# Altium integrated library Supernova Connectors.IntLib: 270 symbols (part 1 of 2) (continued)
## BNC
designator J?
Header BNC Board Edge; Supplier 1: Digi-Key; Supplier 2: Digi-Key; Supplier Part Number 1: WM5524-ND; Supplier Part Number 2: WM5281-ND
footprint 5414373-1 (BNC Connector)
pins: 1 7, 2 7

## C10-737495-001
designator J?  (value not drawn)
Radsert 3.5mm female SMD; Supplier 1: Digi-Key; Supplier 2: Mouser; Supplier Part Number 1: 10-737495-001-ND; Supplier Part Number 2: 654-10-737495-001
footprint C10-737495-001
pins: 1

## Castellation Pad
designator X?  (value not drawn)  (no BOM)
Castellation Pad; System: Connector
footprint castellation pad 50mil
pins: 1

## CLP-129-02-G-D-A
designator H?
Header 58 Pin CLP; System: Connector; Supplier 1: Digi-Key; Supplier 2: Digi-Key; Supplier 3: Digi-Key; Supplier Part Number 1: CLP-129-02-G-D-A-ND; Supplier Part Number 2: CLP-129-02-G-D-A-K-ND; Supplier Part Number 3: CLP-129-02-L-D-A-ND
footprint CLP-129-02-G-D-A
pins: 1, 2, 3, 4, 5, 6, 7, 8, 9, 10, 11, 12, 13, 14, 15, 16, 17, 18, 19, 20, 21, 22, 23, 24, 25, 26, 27, 28, 29, 30, 31, 32, 33, 34, 35, 36, 37, 38, 39, 40, 41, 42, 43, 44, 45, 46, 47, 48, 49, 50, 51, 52, 53, 54, 55, 56, 57, 58

## CLP-130-02-G-D-A
designator H?
Header 60 Pin CLP; System: Connector; Supplier 1: Digi-Key; Supplier 2: Mouser; Supplier Part Number 1: SAM12494-ND; Supplier Part Number 2: 200-CLP13002GDA
footprint CLP-130-02-G-D-A
pins: 1, 2, 3, 4, 5, 6, 7, 8, 9, 10, 11, 12, 13, 14, 15, 16, 17, 18, 19, 20, 21, 22, 23, 24, 25, 26, 27, 28, 29, 30, 31, 32, 33, 34, 35, 36, 37, 38, 39, 40, 41, 42, 43, 44, 45, 46, 47, 48, 49, 50, 51, 52, 53, 54, 55, 56, 57, 58, 59, 60

## CLP-144-02-G-D-A
designator H?
Header 88 Pin CLP; System: Connector; Supplier 1: Digi-Key; Supplier 2: Digi-Key; Supplier Part Number 1: CLP-144-02-G-D-A-ND; Supplier Part Number 2: CLP-144-02-F-D-A-ND
footprint CLP-144-02-G-D-A
pins: 1, 2, 3, 4, 5, 6, 7, 8, 9, 10, 11, 12, 13, 14, 15, 16, 17, 18, 19, 20, 21, 22, 23, 24, 25, 26, 27, 28, 29, 30, 31, 32, 33, 34, 35, 36, 37, 38, 39, 40, 41, 42, 43, 44, 45, 46, 47, 48, 49, 50, 51, 52, 53, 54, 55, 56, 57, 58, 59, 60, 61, 62, 63, 64, 65, 66, 67, 68, 69, 70, 71, 72, 73, 74, 75, 76, 77, 78, 79, 80, 81, 82, 83, 84, 85, 86, 87, 88

## CLT-108-02-G-D-A
designator H?
Header 8x2 Thru Board; System: Connector; Supplier 1: Digi-Key; Supplier 2: Digi-Key; Supplier 3: Digi-Key; Supplier Part Number 1: SAM11024-ND; Supplier Part Number 2: CLT-108-02-G-D-A-K-ND; Supplier Part Number 3: CLT-108-02-G-D-A-P-ND
footprint CLT-108-02-G-D-A
pins: 1, 2, 3, 4, 5, 6, 7, 8, 9, 10, 11 1, 12, 13, 14, 15, 16

## CSK Pad
designator M?, comment CSK Mouting Hole M3  (value not drawn)  (no BOM)
Mounting Hole CSK
footprint CSK Pad
footprint CSK Odd Pad
footprint CSK Pad 100mil dual
footprint CSK Pad 150mil dual
pins: 1

## CubesatBus-H1 ESQ-110-37-G-D
designator H1, comment ESQ-110-37-G-D
Header PC/104 20-pin; System: Connector; Supplier 1: Digi-Key; Supplier Part Number 1: ESQ-110-37-G-D-ND; Supplier 2: Newark; Supplier Part Number 2: 91P9697
footprint ESQ-110-37-G-D 33-52 (ESQ-126-37-G-D Samtech 52-pin connector)
pins: 33 PWR_MHX, 34 -RST_MHX, 35 -CTS_MHX, 36 -RTS_MHX, 37 -DSR_MHX, 38 -DTR_MHX, 39 TXD_MHX, 40 RXD_MHX, 41 SDA_SYS, 42 VBACKUP, 43 SCL_SYS, 44 RSVD0, 45 RSVD1, 46 RSVD2, 47 USER0, 48 USER1, 49 USER2, 50 USER3, 51 USER4, 52 USER5

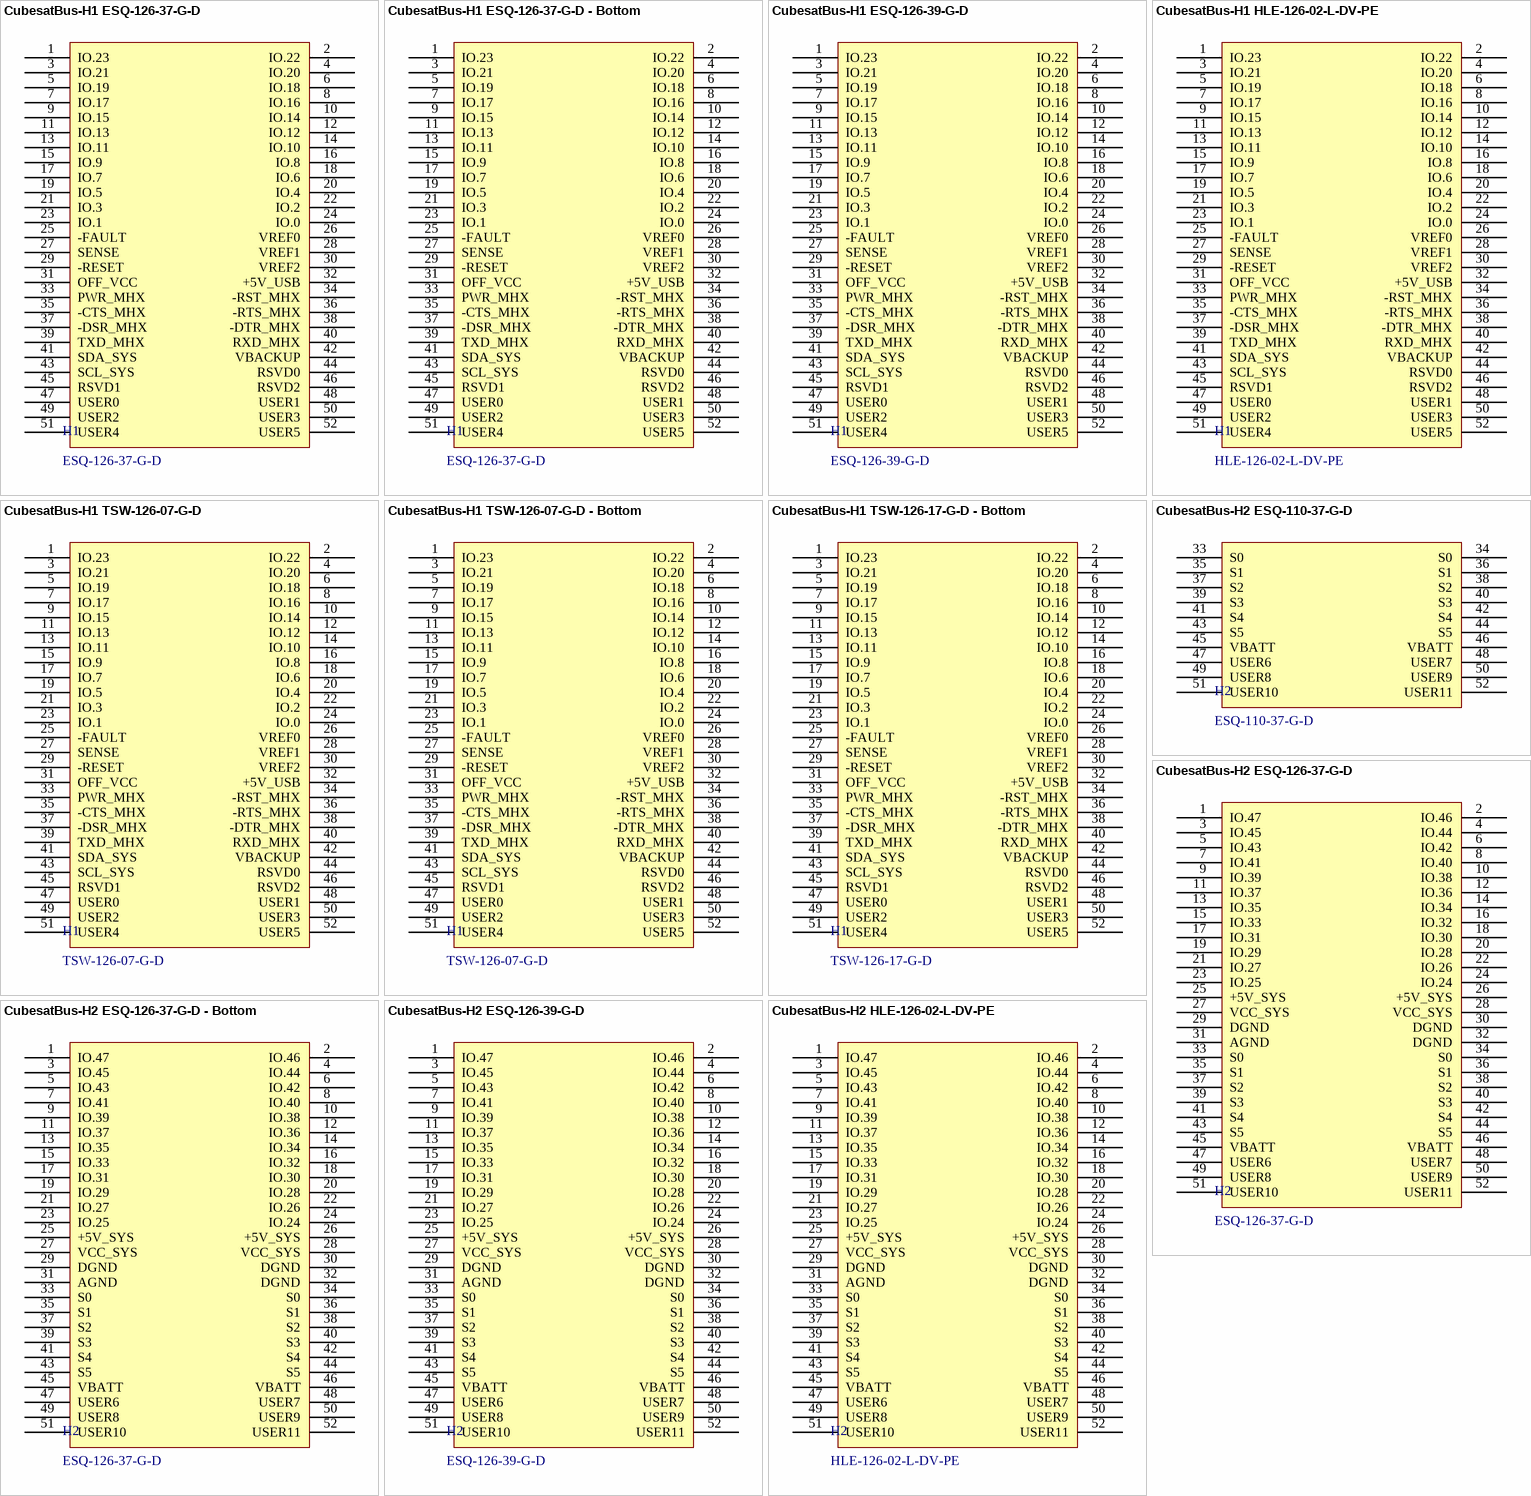
[diagram p2: symbols CubesatBus-H1 ESQ-126-37-G-D to CubesatBus-H2 HLE-126-02-L-DV-PE]

## CubesatBus-H1 ESQ-126-37-G-D
designator H1, comment ESQ-126-37-G-D
Header PC/104 52-pin; System: Connector; Supplier 1: Digi-Key; Supplier Part Number 1: SAM9323-ND; Supplier 2: Newark; Supplier Part Number 2: 92P1369
footprint ESQ-126-37-G-D (ESQ-126-37-G-D Samtech 52-pin connector)
pins: 1 IO.23, 2 IO.22, 3 IO.21, 4 IO.20, 5 IO.19, 6 IO.18, 7 IO.17, 8 IO.16, 9 IO.15, 10 IO.14, 11 IO.13, 12 IO.12, 13 IO.11, 14 IO.10, 15 IO.9, 16 IO.8, 17 IO.7, 18 IO.6, 19 IO.5, 20 IO.4, 21 IO.3, 22 IO.2, 23 IO.1, 24 IO.0, 25 -FAULT, 26 VREF0, 27 SENSE, 28 VREF1, 29 -RESET, 30 VREF2, 31 OFF_VCC, 32 +5V_USB, 33 PWR_MHX, 34 -RST_MHX, 35 -CTS_MHX, 36 -RTS_MHX, 37 -DSR_MHX, 38 -DTR_MHX, 39 TXD_MHX, 40 RXD_MHX, 41 SDA_SYS, 42 VBACKUP, 43 SCL_SYS, 44 RSVD0, 45 RSVD1, 46 RSVD2, 47 USER0, 48 USER1, 49 USER2, 50 USER3, 51 USER4, 52 USER5

## CubesatBus-H1 ESQ-126-37-G-D - Bottom
designator H1, comment ESQ-126-37-G-D
Header PC/104 52-pin; System: Connector; Supplier 1: Digi-Key; Supplier Part Number 1: SAM9323-ND; Supplier 2: Newark; Supplier Part Number 2: 92P1369
footprint ESQ-126-37-G-D - bottom (ESQ-126-37-G-D Samtech 52-pin connector)
pins: 1 IO.23, 2 IO.22, 3 IO.21, 4 IO.20, 5 IO.19, 6 IO.18, 7 IO.17, 8 IO.16, 9 IO.15, 10 IO.14, 11 IO.13, 12 IO.12, 13 IO.11, 14 IO.10, 15 IO.9, 16 IO.8, 17 IO.7, 18 IO.6, 19 IO.5, 20 IO.4, 21 IO.3, 22 IO.2, 23 IO.1, 24 IO.0, 25 -FAULT, 26 VREF0, 27 SENSE, 28 VREF1, 29 -RESET, 30 VREF2, 31 OFF_VCC, 32 +5V_USB, 33 PWR_MHX, 34 -RST_MHX, 35 -CTS_MHX, 36 -RTS_MHX, 37 -DSR_MHX, 38 -DTR_MHX, 39 TXD_MHX, 40 RXD_MHX, 41 SDA_SYS, 42 VBACKUP, 43 SCL_SYS, 44 RSVD0, 45 RSVD1, 46 RSVD2, 47 USER0, 48 USER1, 49 USER2, 50 USER3, 51 USER4, 52 USER5

## CubesatBus-H1 ESQ-126-39-G-D
designator H1, comment ESQ-126-39-G-D
Header PC/104 52-pin; System: Connector; Supplier 1: Digi-Key; Supplier Part Number 1: SAM10462-ND; Supplier 2: Newark; Supplier Part Number 2: 92P1376
footprint ESQ-126-39-G-D (ESQ-126-39-G-D Samtech 52-pin connector)
pins: 1 IO.23, 2 IO.22, 3 IO.21, 4 IO.20, 5 IO.19, 6 IO.18, 7 IO.17, 8 IO.16, 9 IO.15, 10 IO.14, 11 IO.13, 12 IO.12, 13 IO.11, 14 IO.10, 15 IO.9, 16 IO.8, 17 IO.7, 18 IO.6, 19 IO.5, 20 IO.4, 21 IO.3, 22 IO.2, 23 IO.1, 24 IO.0, 25 -FAULT, 26 VREF0, 27 SENSE, 28 VREF1, 29 -RESET, 30 VREF2, 31 OFF_VCC, 32 +5V_USB, 33 PWR_MHX, 34 -RST_MHX, 35 -CTS_MHX, 36 -RTS_MHX, 37 -DSR_MHX, 38 -DTR_MHX, 39 TXD_MHX, 40 RXD_MHX, 41 SDA_SYS, 42 VBACKUP, 43 SCL_SYS, 44 RSVD0, 45 RSVD1, 46 RSVD2, 47 USER0, 48 USER1, 49 USER2, 50 USER3, 51 USER4, 52 USER5

## CubesatBus-H1 HLE-126-02-L-DV-PE
designator H1, comment HLE-126-02-L-DV-PE
Header PC/104 52-pin; System: Connector; Supplier 1: Digi-Key; Supplier Part Number 1: HLE-126-02-L-DV-PE-ND; Supplier 2: Newark; Supplier Part Number 2: 84T4155
footprint HLE-126-02-L-DV-PE
pins: 1 IO.23, 2 IO.22, 3 IO.21, 4 IO.20, 5 IO.19, 6 IO.18, 7 IO.17, 8 IO.16, 9 IO.15, 10 IO.14, 11 IO.13, 12 IO.12, 13 IO.11, 14 IO.10, 15 IO.9, 16 IO.8, 17 IO.7, 18 IO.6, 19 IO.5, 20 IO.4, 21 IO.3, 22 IO.2, 23 IO.1, 24 IO.0, 25 -FAULT, 26 VREF0, 27 SENSE, 28 VREF1, 29 -RESET, 30 VREF2, 31 OFF_VCC, 32 +5V_USB, 33 PWR_MHX, 34 -RST_MHX, 35 -CTS_MHX, 36 -RTS_MHX, 37 -DSR_MHX, 38 -DTR_MHX, 39 TXD_MHX, 40 RXD_MHX, 41 SDA_SYS, 42 VBACKUP, 43 SCL_SYS, 44 RSVD0, 45 RSVD1, 46 RSVD2, 47 USER0, 48 USER1, 49 USER2, 50 USER3, 51 USER4, 52 USER5

## CubesatBus-H1 TSW-126-07-G-D
designator H1, comment TSW-126-07-G-D
Header PC/104 52-pin; System: Connector; Supplier 1: Digi-Key; Supplier Part Number 1: SAM1028-26-ND; Supplier 2: Newark; Supplier 3: Digi-Key; Supplier Part Number 2: 12P2847; Supplier Part Number 3: HTSW-126-07-G-D-ND
footprint TSW-126-07-G-D (TSW-126-07-G-D Samtech 52-pin connector)
pins: 1 IO.23, 2 IO.22, 3 IO.21, 4 IO.20, 5 IO.19, 6 IO.18, 7 IO.17, 8 IO.16, 9 IO.15, 10 IO.14, 11 IO.13, 12 IO.12, 13 IO.11, 14 IO.10, 15 IO.9, 16 IO.8, 17 IO.7, 18 IO.6, 19 IO.5, 20 IO.4, 21 IO.3, 22 IO.2, 23 IO.1, 24 IO.0, 25 -FAULT, 26 VREF0, 27 SENSE, 28 VREF1, 29 -RESET, 30 VREF2, 31 OFF_VCC, 32 +5V_USB, 33 PWR_MHX, 34 -RST_MHX, 35 -CTS_MHX, 36 -RTS_MHX, 37 -DSR_MHX, 38 -DTR_MHX, 39 TXD_MHX, 40 RXD_MHX, 41 SDA_SYS, 42 VBACKUP, 43 SCL_SYS, 44 RSVD0, 45 RSVD1, 46 RSVD2, 47 USER0, 48 USER1, 49 USER2, 50 USER3, 51 USER4, 52 USER5

## CubesatBus-H1 TSW-126-07-G-D - Bottom
designator H1, comment TSW-126-07-G-D
Header PC/104 52-pin; System: Connector; Supplier 1: Digi-Key; Supplier Part Number 1: SAM1028-26-ND; Supplier 2: Newark; Supplier 3: Digi-Key; Supplier Part Number 2: 12P2847; Supplier Part Number 3: HTSW-126-07-G-D-ND
footprint TSW-126-07-G-D - BOTTOM (TSW-126-07-G-D Samtech 52-pin connector)
pins: 1 IO.23, 2 IO.22, 3 IO.21, 4 IO.20, 5 IO.19, 6 IO.18, 7 IO.17, 8 IO.16, 9 IO.15, 10 IO.14, 11 IO.13, 12 IO.12, 13 IO.11, 14 IO.10, 15 IO.9, 16 IO.8, 17 IO.7, 18 IO.6, 19 IO.5, 20 IO.4, 21 IO.3, 22 IO.2, 23 IO.1, 24 IO.0, 25 -FAULT, 26 VREF0, 27 SENSE, 28 VREF1, 29 -RESET, 30 VREF2, 31 OFF_VCC, 32 +5V_USB, 33 PWR_MHX, 34 -RST_MHX, 35 -CTS_MHX, 36 -RTS_MHX, 37 -DSR_MHX, 38 -DTR_MHX, 39 TXD_MHX, 40 RXD_MHX, 41 SDA_SYS, 42 VBACKUP, 43 SCL_SYS, 44 RSVD0, 45 RSVD1, 46 RSVD2, 47 USER0, 48 USER1, 49 USER2, 50 USER3, 51 USER4, 52 USER5

## CubesatBus-H1 TSW-126-17-G-D - Bottom
designator H1, comment TSW-126-17-G-D
Header PC/104 52-pin; System: Connector; Supplier 1: Digi-Key; Supplier Part Number 1: SAM1060-26-ND; Supplier 2: Newark; Supplier Part Number 2: 12P2879
footprint TSW-126-17-G-D - BOTTOM (TSW-126-17-G-D Samtech 52-pin connector)
pins: 1 IO.23, 2 IO.22, 3 IO.21, 4 IO.20, 5 IO.19, 6 IO.18, 7 IO.17, 8 IO.16, 9 IO.15, 10 IO.14, 11 IO.13, 12 IO.12, 13 IO.11, 14 IO.10, 15 IO.9, 16 IO.8, 17 IO.7, 18 IO.6, 19 IO.5, 20 IO.4, 21 IO.3, 22 IO.2, 23 IO.1, 24 IO.0, 25 -FAULT, 26 VREF0, 27 SENSE, 28 VREF1, 29 -RESET, 30 VREF2, 31 OFF_VCC, 32 +5V_USB, 33 PWR_MHX, 34 -RST_MHX, 35 -CTS_MHX, 36 -RTS_MHX, 37 -DSR_MHX, 38 -DTR_MHX, 39 TXD_MHX, 40 RXD_MHX, 41 SDA_SYS, 42 VBACKUP, 43 SCL_SYS, 44 RSVD0, 45 RSVD1, 46 RSVD2, 47 USER0, 48 USER1, 49 USER2, 50 USER3, 51 USER4, 52 USER5

## CubesatBus-H2 ESQ-110-37-G-D
designator H2, comment ESQ-110-37-G-D
Header PC/104 20-pin; System: Connector; Supplier 1: Digi-Key; Supplier Part Number 1: ESQ-110-37-G-D-ND; Supplier 2: Newark; Supplier Part Number 2: 91P9697
footprint ESQ-110-37-G-D 33-52 (ESQ-126-37-G-D Samtech 52-pin connector)
pins: 33 S0, 34 S0, 35 S1, 36 S1, 37 S2, 38 S2, 39 S3, 40 S3, 41 S4, 42 S4, 43 S5, 44 S5, 45 VBATT, 46 VBATT, 47 USER6, 48 USER7, 49 USER8, 50 USER9, 51 USER10, 52 USER11

## CubesatBus-H2 ESQ-126-37-G-D
designator H2, comment ESQ-126-37-G-D
Header PC/104 52-pin; System: Connector; Supplier 1: Digi-Key; Supplier Part Number 1: SAM9323-ND; Supplier 2: Newark; Supplier Part Number 2: 92P1369
footprint ESQ-126-37-G-D (ESQ-126-37-G-D Samtech 52-pin connector)
pins: 1 IO.47, 2 IO.46, 3 IO.45, 4 IO.44, 5 IO.43, 6 IO.42, 7 IO.41, 8 IO.40, 9 IO.39, 10 IO.38, 11 IO.37, 12 IO.36, 13 IO.35, 14 IO.34, 15 IO.33, 16 IO.32, 17 IO.31, 18 IO.30, 19 IO.29, 20 IO.28, 21 IO.27, 22 IO.26, 23 IO.25, 24 IO.24, 25 +5V_SYS, 26 +5V_SYS, 27 VCC_SYS, 28 VCC_SYS, 29 DGND, 30 DGND, 31 AGND, 32 DGND, 33 S0, 34 S0, 35 S1, 36 S1, 37 S2, 38 S2, 39 S3, 40 S3, 41 S4, 42 S4, 43 S5, 44 S5, 45 VBATT, 46 VBATT, 47 USER6, 48 USER7, 49 USER8, 50 USER9, 51 USER10, 52 USER11

## CubesatBus-H2 ESQ-126-37-G-D - Bottom
designator H2, comment ESQ-126-37-G-D
Header PC/104 52-pin; System: Connector; Supplier 1: Digi-Key; Supplier Part Number 1: SAM9323-ND; Supplier 2: Newark; Supplier Part Number 2: 92P1369
footprint ESQ-126-37-G-D - bottom (ESQ-126-37-G-D Samtech 52-pin connector)
pins: 1 IO.47, 2 IO.46, 3 IO.45, 4 IO.44, 5 IO.43, 6 IO.42, 7 IO.41, 8 IO.40, 9 IO.39, 10 IO.38, 11 IO.37, 12 IO.36, 13 IO.35, 14 IO.34, 15 IO.33, 16 IO.32, 17 IO.31, 18 IO.30, 19 IO.29, 20 IO.28, 21 IO.27, 22 IO.26, 23 IO.25, 24 IO.24, 25 +5V_SYS, 26 +5V_SYS, 27 VCC_SYS, 28 VCC_SYS, 29 DGND, 30 DGND, 31 AGND, 32 DGND, 33 S0, 34 S0, 35 S1, 36 S1, 37 S2, 38 S2, 39 S3, 40 S3, 41 S4, 42 S4, 43 S5, 44 S5, 45 VBATT, 46 VBATT, 47 USER6, 48 USER7, 49 USER8, 50 USER9, 51 USER10, 52 USER11

## CubesatBus-H2 ESQ-126-39-G-D
designator H2, comment ESQ-126-39-G-D
Header PC/104 52-pin; System: Connector; Supplier 1: Digi-Key; Supplier Part Number 1: SAM10462-ND; Supplier 2: Newark; Supplier Part Number 2: 92P1376
footprint ESQ-126-39-G-D (ESQ-126-39-G-D Samtech 52-pin connector)
pins: 1 IO.47, 2 IO.46, 3 IO.45, 4 IO.44, 5 IO.43, 6 IO.42, 7 IO.41, 8 IO.40, 9 IO.39, 10 IO.38, 11 IO.37, 12 IO.36, 13 IO.35, 14 IO.34, 15 IO.33, 16 IO.32, 17 IO.31, 18 IO.30, 19 IO.29, 20 IO.28, 21 IO.27, 22 IO.26, 23 IO.25, 24 IO.24, 25 +5V_SYS, 26 +5V_SYS, 27 VCC_SYS, 28 VCC_SYS, 29 DGND, 30 DGND, 31 AGND, 32 DGND, 33 S0, 34 S0, 35 S1, 36 S1, 37 S2, 38 S2, 39 S3, 40 S3, 41 S4, 42 S4, 43 S5, 44 S5, 45 VBATT, 46 VBATT, 47 USER6, 48 USER7, 49 USER8, 50 USER9, 51 USER10, 52 USER11

## CubesatBus-H2 HLE-126-02-L-DV-PE
designator H2, comment HLE-126-02-L-DV-PE
Header PC/104 52-pin; System: Connector; Supplier 1: Digi-Key; Supplier Part Number 1: HLE-126-02-L-DV-PE-ND; Supplier 2: Newark; Supplier Part Number 2: 84T4155
footprint HLE-126-02-L-DV-PE
pins: 1 IO.47, 2 IO.46, 3 IO.45, 4 IO.44, 5 IO.43, 6 IO.42, 7 IO.41, 8 IO.40, 9 IO.39, 10 IO.38, 11 IO.37, 12 IO.36, 13 IO.35, 14 IO.34, 15 IO.33, 16 IO.32, 17 IO.31, 18 IO.30, 19 IO.29, 20 IO.28, 21 IO.27, 22 IO.26, 23 IO.25, 24 IO.24, 25 +5V_SYS, 26 +5V_SYS, 27 VCC_SYS, 28 VCC_SYS, 29 DGND, 30 DGND, 31 AGND, 32 DGND, 33 S0, 34 S0, 35 S1, 36 S1, 37 S2, 38 S2, 39 S3, 40 S3, 41 S4, 42 S4, 43 S5, 44 S5, 45 VBATT, 46 VBATT, 47 USER6, 48 USER7, 49 USER8, 50 USER9, 51 USER10, 52 USER11

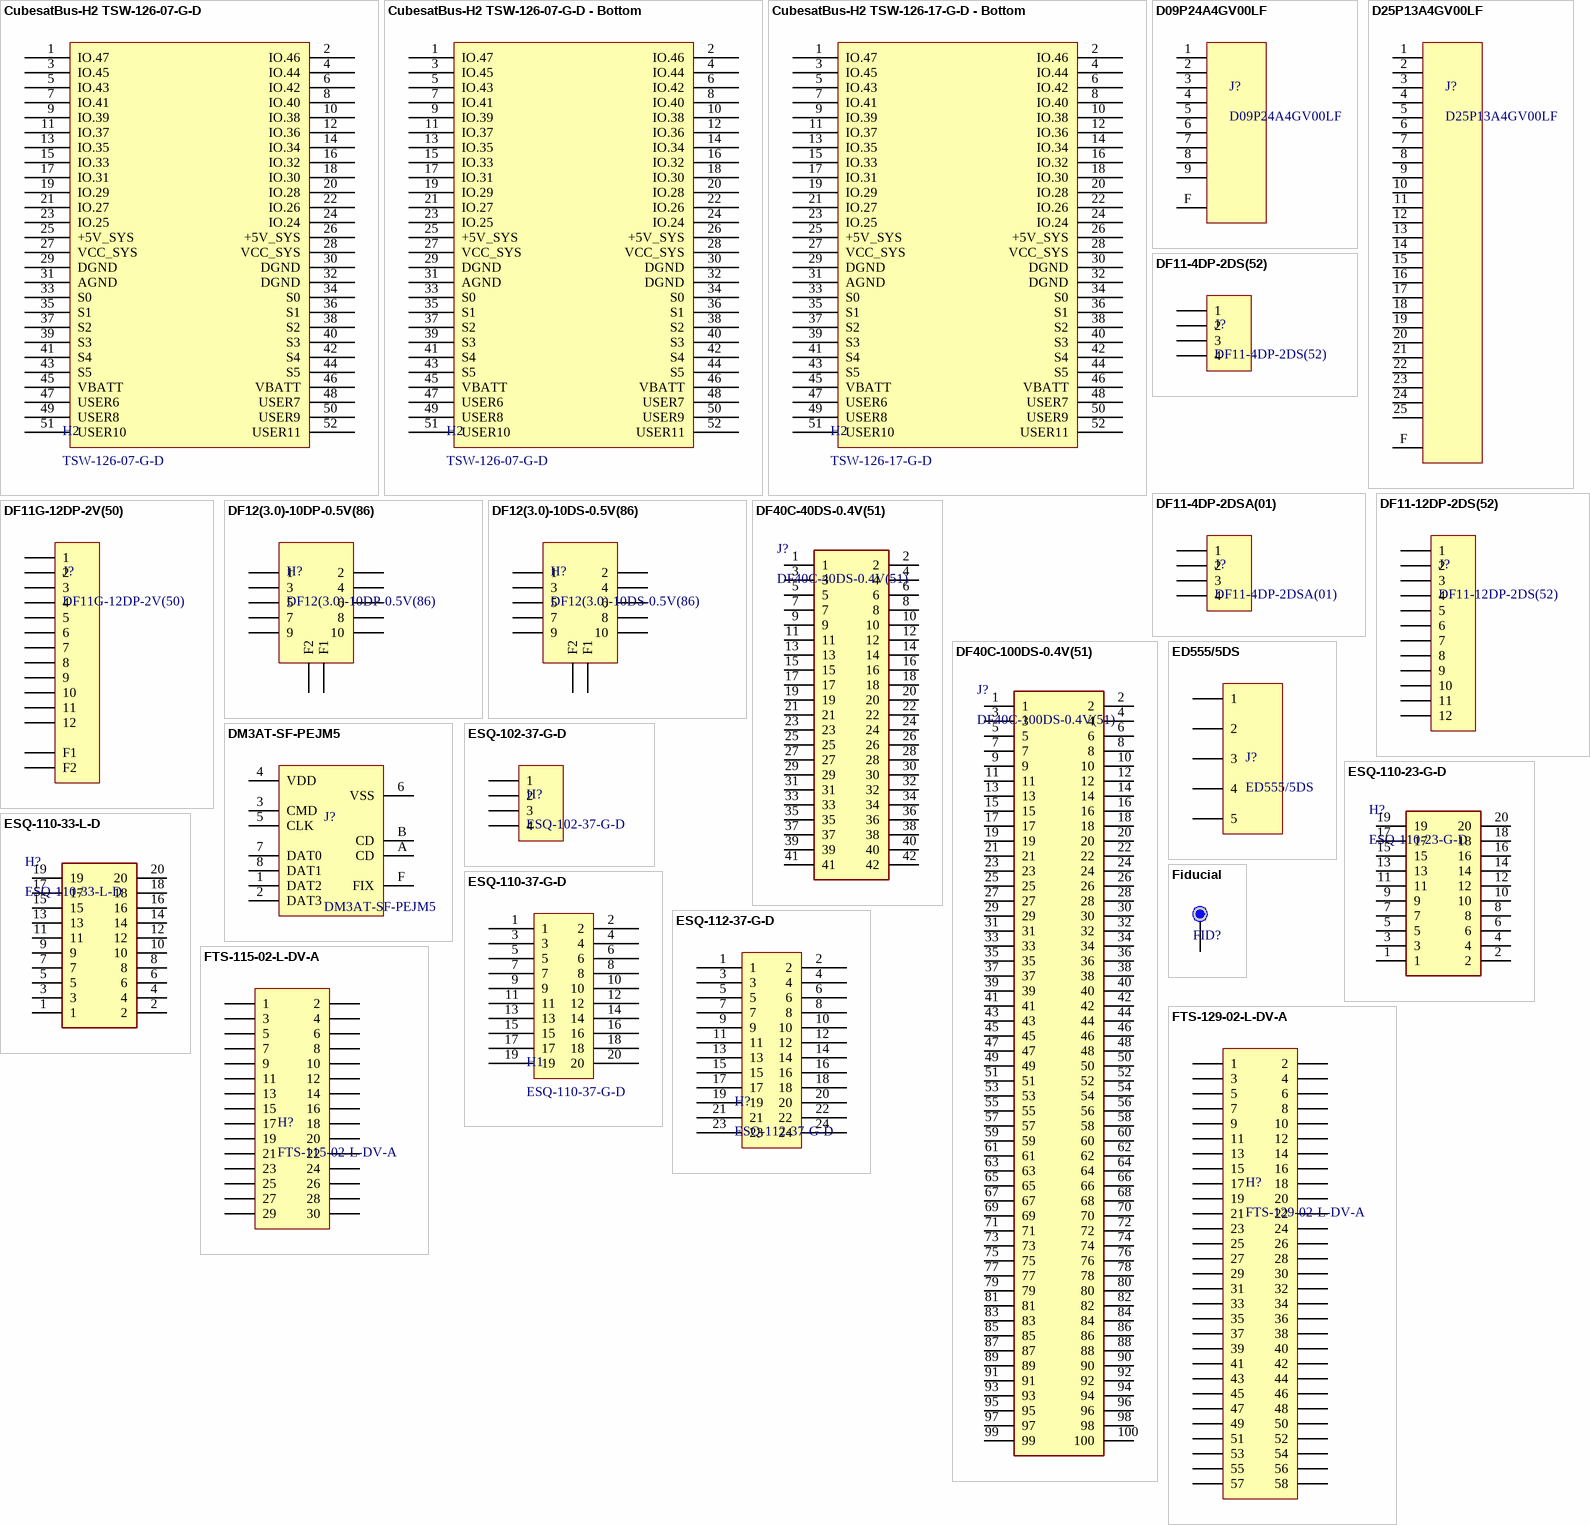
[diagram p3: symbols CubesatBus-H2 TSW-126-07-G-D to FTS-129-02-L-DV-A]

## CubesatBus-H2 TSW-126-07-G-D
designator H2, comment TSW-126-07-G-D
Header PC/104 52-pin; System: Connector; Supplier 1: Digi-Key; Supplier Part Number 1: SAM1028-26-ND; Supplier 2: Digi-Key; Supplier 3: Newark; Supplier Part Number 2: HTSW-126-07-G-D-ND; Supplier Part Number 3: 12P2847
footprint TSW-126-07-G-D (TSW-126-07-G-D Samtech 52-pin connector)
pins: 1 IO.47, 2 IO.46, 3 IO.45, 4 IO.44, 5 IO.43, 6 IO.42, 7 IO.41, 8 IO.40, 9 IO.39, 10 IO.38, 11 IO.37, 12 IO.36, 13 IO.35, 14 IO.34, 15 IO.33, 16 IO.32, 17 IO.31, 18 IO.30, 19 IO.29, 20 IO.28, 21 IO.27, 22 IO.26, 23 IO.25, 24 IO.24, 25 +5V_SYS, 26 +5V_SYS, 27 VCC_SYS, 28 VCC_SYS, 29 DGND, 30 DGND, 31 AGND, 32 DGND, 33 S0, 34 S0, 35 S1, 36 S1, 37 S2, 38 S2, 39 S3, 40 S3, 41 S4, 42 S4, 43 S5, 44 S5, 45 VBATT, 46 VBATT, 47 USER6, 48 USER7, 49 USER8, 50 USER9, 51 USER10, 52 USER11

## CubesatBus-H2 TSW-126-07-G-D - Bottom
designator H2, comment TSW-126-07-G-D
Header PC/104 52-pin; System: Connector; Supplier 1: Digi-Key; Supplier Part Number 1: SAM1028-26-ND; Supplier 2: Digi-Key; Supplier 3: Newark; Supplier Part Number 2: HTSW-126-07-G-D-ND; Supplier Part Number 3: 12P2847
footprint TSW-126-07-G-D - BOTTOM (TSW-126-07-G-D Samtech 52-pin connector)
pins: 1 IO.47, 2 IO.46, 3 IO.45, 4 IO.44, 5 IO.43, 6 IO.42, 7 IO.41, 8 IO.40, 9 IO.39, 10 IO.38, 11 IO.37, 12 IO.36, 13 IO.35, 14 IO.34, 15 IO.33, 16 IO.32, 17 IO.31, 18 IO.30, 19 IO.29, 20 IO.28, 21 IO.27, 22 IO.26, 23 IO.25, 24 IO.24, 25 +5V_SYS, 26 +5V_SYS, 27 VCC_SYS, 28 VCC_SYS, 29 DGND, 30 DGND, 31 AGND, 32 DGND, 33 S0, 34 S0, 35 S1, 36 S1, 37 S2, 38 S2, 39 S3, 40 S3, 41 S4, 42 S4, 43 S5, 44 S5, 45 VBATT, 46 VBATT, 47 USER6, 48 USER7, 49 USER8, 50 USER9, 51 USER10, 52 USER11

## CubesatBus-H2 TSW-126-17-G-D - Bottom
designator H2, comment TSW-126-17-G-D
Header PC/104 52-pin; System: Connector; Supplier 1: Digi-Key; Supplier Part Number 1: SAM1060-26-ND; Supplier 2: Newark; Supplier Part Number 2: 12P2879
footprint TSW-126-17-G-D - BOTTOM (TSW-126-17-G-D Samtech 52-pin connector)
pins: 1 IO.47, 2 IO.46, 3 IO.45, 4 IO.44, 5 IO.43, 6 IO.42, 7 IO.41, 8 IO.40, 9 IO.39, 10 IO.38, 11 IO.37, 12 IO.36, 13 IO.35, 14 IO.34, 15 IO.33, 16 IO.32, 17 IO.31, 18 IO.30, 19 IO.29, 20 IO.28, 21 IO.27, 22 IO.26, 23 IO.25, 24 IO.24, 25 +5V_SYS, 26 +5V_SYS, 27 VCC_SYS, 28 VCC_SYS, 29 DGND, 30 DGND, 31 AGND, 32 DGND, 33 S0, 34 S0, 35 S1, 36 S1, 37 S2, 38 S2, 39 S3, 40 S3, 41 S4, 42 S4, 43 S5, 44 S5, 45 VBATT, 46 VBATT, 47 USER6, 48 USER7, 49 USER8, 50 USER9, 51 USER10, 52 USER11

## D09P24A4GV00LF
designator J?
Header DB9 TH with Jack Screws; System: Connector; Supplier 1: Digi-Key; Supplier 2: Digi-Key; Supplier Part Number 1: 609-1479-ND; Supplier Part Number 2: 609-5184-ND
footprint D09P24A4GV00LF
pins: 1, 2, 3 1, 4 1, 5 1, 6, 7, 8, 9, F

## D25P13A4GV00LF
designator J?
Header DB25 TH RA; System: Connector; Supplier 1: Digi-Key; Supplier 2: Mouser; Supplier Part Number 1: 609-1501-ND; Supplier Part Number 2: 649-D25P13A4GV00LF
footprint D-Sub-25
pins: 1, 2, 3, 4, 5, 6, 7, 8, 9, 10, 11, 12, 13, 14, 15, 16, 17, 18, 19, 20, 21, 22, 23, 24, 25, F

## DF11-4DP-2DS(52)
designator J?
Header DF11-RA-TH 4-Pin; System: Connector; Supplier 1: Digi-Key; Supplier Part Number 1: H2865-ND; Supplier 2: Mouser; Supplier Part Number 2: 798-DF11-4DP-2DS52
footprint DF11-4-RA
pins: 1, 2, 3, 4

## DF11-4DP-2DSA(01)
designator J?
Header DF11-TH 4-Pin; System: Connector; Supplier 1: Digi-Key; Supplier Part Number 1: H2850-ND; Supplier 2: Mouser; Supplier Part Number 2: 798-DF11-4DP-2DSA01
footprint DF11-4-TH
pins: 1, 2, 3, 4

## DF11-12DP-2DS(52)
designator J?
Header DF11-RA-TH 12-Pin; System: Connector; Supplier 1: Digi-Key; Supplier 2: Farnell; Supplier 3: Newark; Supplier Part Number 1: H2869-ND; Supplier Part Number 2: 2724887; Supplier Part Number 3: 13AC8440
footprint DF11-12-RA
pins: 1, 2, 3, 4, 5, 6, 7, 8, 9, 10, 11, 12

## DF11G-12DP-2V(50)
designator J?
Header DF11 12-Pin; System: Connector; Supplier 1: Digi-Key; Supplier 2: Mouser; Supplier Part Number 2: 798-DF11G-12DP-2V50; Supplier Part Number 1: H2901-ND
footprint DF11G-12DP-2V(50)
pins: 1, 2, 3, 4, 5, 6, 7, 8, 9, 10, 11, 12, F1, F2

## DF12(3.0)-10DP-0.5V(86)
designator H?
Header DF12 10-Pin Female; System: Connector; Supplier 1: Digi-Key; Supplier 2: Mouser; Supplier Part Number 1: H11699CT-ND; Supplier Part Number 2: 798-DF123010DP05V86
footprint DF12(3.0)-10DP-0.5V(86)
pins: 1, 2, 3, 4, 5, 6, 7, 8, 9, 10, F1, F2

## DF12(3.0)-10DS-0.5V(86)
designator H?
Header DF12 10-Pin Male; System: Connector; Supplier 1: Mouser; Supplier 2: Digi-Key; Supplier Part Number 1: 798-DF123010DS05V86; Supplier Part Number 2: H11700CT-ND
footprint DF12(3.0)-10DS-0.5V(86)
pins: 1, 2, 3, 4, 5, 6, 7, 8, 9, 10, F1, F2

## DF40C-40DS-0.4V(51)
designator J?
CONN RCPT 40POS SMD GOLD; Manufacturer_Name: Hirose; Datasheet Link: https://www.hirose.com/product/download/?distributor=digikey&type=2d&lang=en&num=DF40C-40DS-0.4V(51); Height: 1.65mm; Manufacturer_Part_Number: DF40C-40DS-0.4V(51); Mouser Part Number: 798-DF40C40DS0.4V51; Mouser Price/Stock: https://www.mouser.co.uk/ProductDetail/Hirose-Connector/DF40C-40DS-0.4V51?qs=eDUdFcBPps3TglLeCFrcgA%3D%3D; Arrow Part Number: DF40C-40DS-0.4V(51); Arrow Price/Stock: https://www.arrow.com/en/products/df40c-40ds-0.4v-51/hirose-electric; Supplier 1: Digi-Key; Supplier 2: Mouser; Supplier Part Number 1: H11625CT-ND; Supplier Part Number 2: 798-DF40C40DS0.4V51
footprint DF40C40DS04V51 42 pins
footprint DF40C40DS04V51
pins: 1, 2, 3, 4, 5, 6, 7, 8, 9, 10, 11, 12, 13, 14, 15, 16, 17, 18, 19, 20, 21, 22, 23, 24, 25, 26, 27, 28, 29, 30, 31, 32, 33, 34, 35, 36, 37, 38, 39, 40, 41, 42